# Altium footprint library En.PcbLib: 157 footprints (part 2 of 10)
Each footprint in its own frame and in the unit in brackets; x right, y up, seen from the top. Pads: shape width x height; smd on the part's side, far side on the other; paste and mask are expansions set on the pad; w line width, h text height; cw(c..) or ccw(c..) is an arc to the next point about the centre after c.
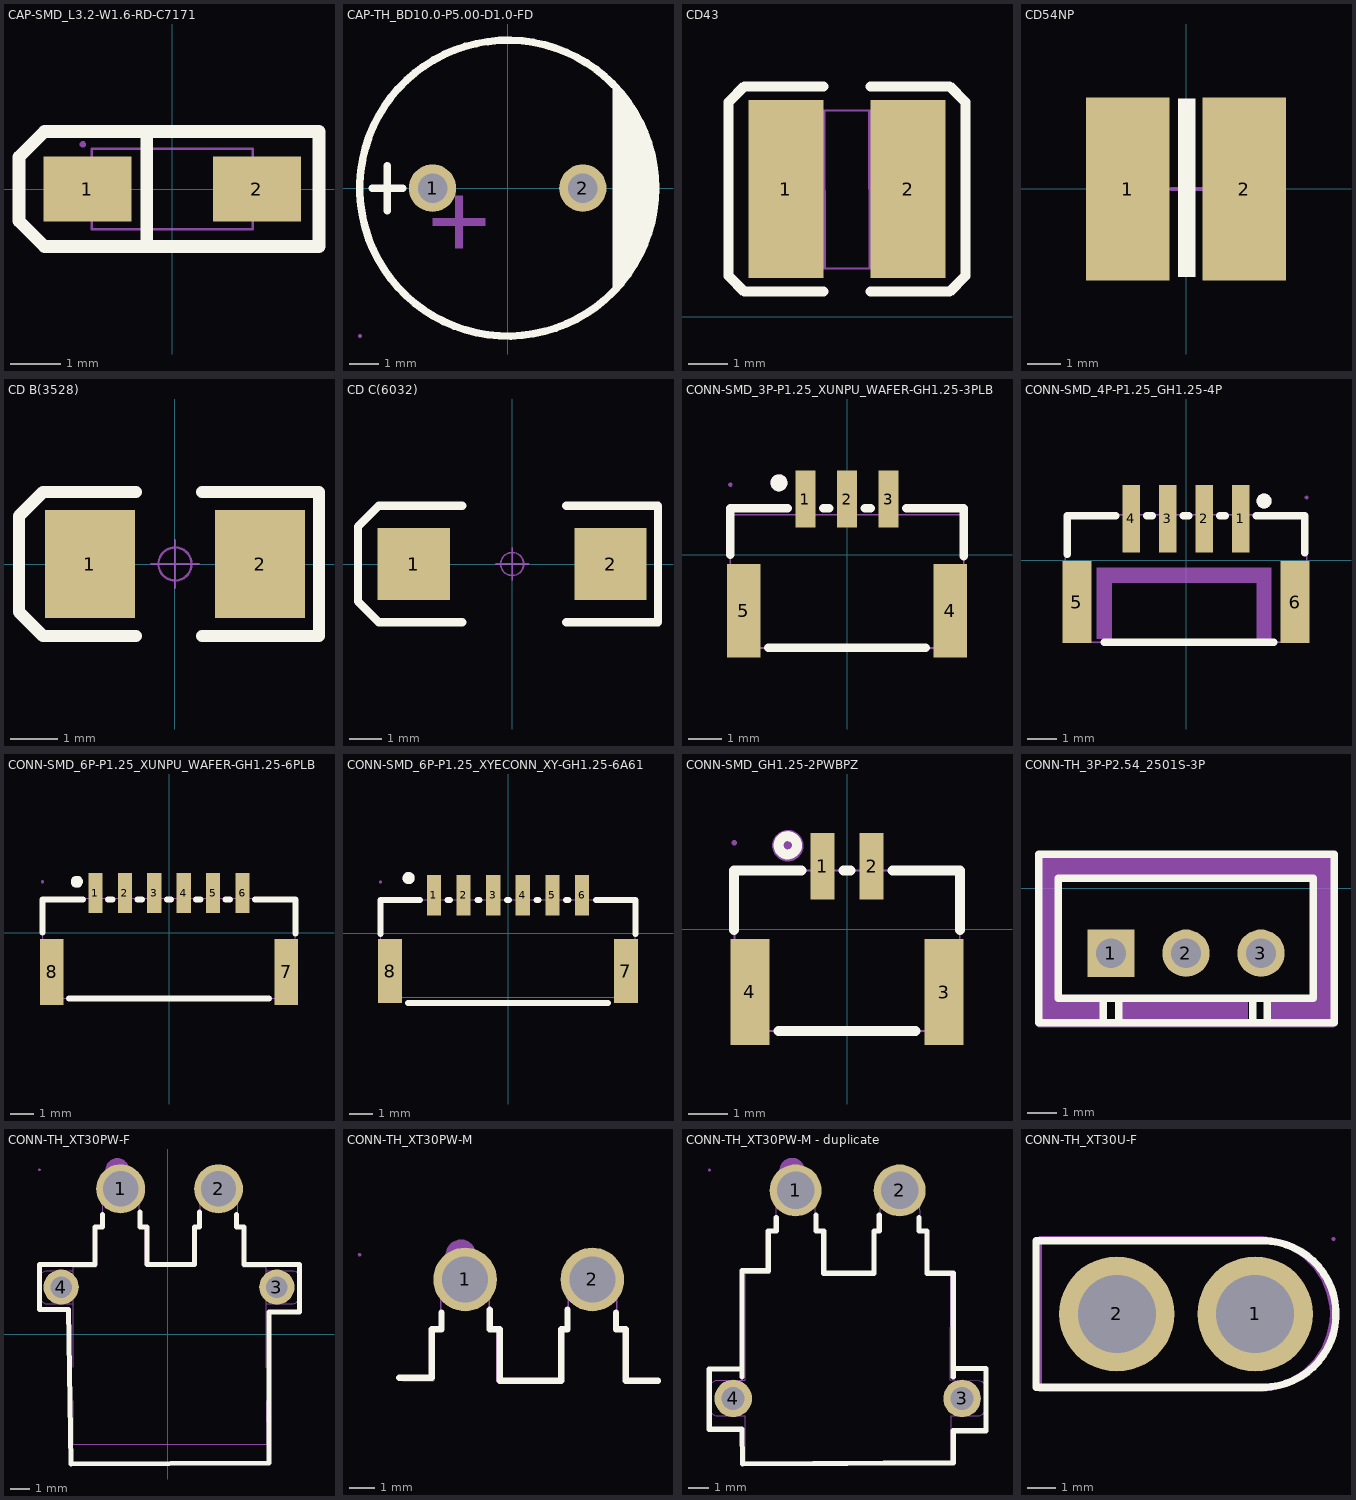
[diagram p1: the footprints below, top view; thin cyan lines are the x and y axes]

## CAP-SMD_L3.2-W1.6-RD-C7171 [mm]
pads (2):
  rect 1.758x1.296 smd: 1(-1.686,0) 2(1.686,0)
Top Overlay:
  lines w0.254: -0.508,-1.016 -0.508,1.016 ; -3.048,-0.635 -3.048,0.635 -2.54,1.143 -0.889,1.143 2.921,1.143 2.921,-1.143 -0.381,-1.143 -2.54,-1.143 -3.048,-0.635
Mechanical 15:
  region: -1.83,0.6 -1.83,-0.6 -0.98,-0.6 -0.98,0.6
  region: 1.83,0.6 1.83,-0.6 0.98,-0.6 0.98,0.6
  region: -1.718,0.889 -1.719,0.913 -1.754,0.946 -1.802,0.946 -1.837,0.913 -1.838,0.889 -1.837,0.865 -1.802,0.832 -1.754,0.832 -1.719,0.865
  lines w0.051: -1.6,-0.8 -1.6,0.8 1.6,0.8 1.6,-0.8 -1.6,-0.8
3D body "User Library-CAP_TANT_3216-18_A_case-1.SLDPRT": height 1.7, standoff 0, extent -1.7,-0.9 1.7,0.9

## CAP-TH_BD10.0-P5.00-D1.0-FD [mm]
pads (2):
  round 1.6 hole 1: 1(-2.54,0) 2(2.54,0)
Top Overlay:
  circle w0.254: c0,0 r5
  region: 3.556,3.556 3.556,-3.556 4.318,-2.54 4.826,-1.016 5.08,0.508 4.826,1.524
  lines w0.254: -4.572,0 -3.556,0 ; -4.064,-0.762 -4.064,0.762
Mechanical 6:
  region: -1.778,-0.762 -1.778,-2.032 -1.524,-2.032 -1.524,-0.254 -1.778,-0.254
  region: -2.54,-1.016 -0.762,-1.016 -0.762,-1.27 -2.54,-1.27
Mechanical 15:
  region: -2.24,0 -2.241,0.059 -2.288,0.167 -2.372,0.25 -2.481,0.294 -2.599,0.294 -2.708,0.25 -2.792,0.167 -2.839,0.059 -2.84,0 -2.839,-0.059 -2.792,-0.167 -2.708,-0.25 -2.599,-0.294 -2.481,-0.294 -2.372,-0.25 -2.288,-0.167 -2.241,-0.059
  region: 2.84,0 2.839,0.059 2.792,0.167 2.708,0.25 2.599,0.294 2.481,0.294 2.372,0.25 2.288,0.167 2.241,0.059 2.24,0 2.241,-0.059 2.288,-0.167 2.372,-0.25 2.481,-0.294 2.599,-0.294 2.708,-0.25 2.792,-0.167 2.839,-0.059
  region: -4.94,-5 -4.94,-4.975 -4.975,-4.94 -5.025,-4.94 -5.06,-4.975 -5.06,-5 -5.06,-5.025 -5.025,-5.06 -4.975,-5.06 -4.94,-5.025
  lines w0.051: -5,0 ccw(c0,0) 5,0 ccw(c0,0) -5,0
3D body "User Library-CE_R200_D400_H800.SLDPRT": height 20.32, standoff -2.9, extent -4.953,-5.078 5.207,5.078

## CD43 [mm]
pads (2):
  rect 1.9x4.5 smd: 1(30.787,3.236) 2(33.887,3.236)
Top Overlay:
  lines w0.254: 31.737,0.635 29.736,0.635 29.337,1.036 29.337,5.436 29.736,5.837 31.737,5.837 ; 32.936,0.635 34.938,0.635 35.336,1.036 35.336,5.436 34.938,5.837 32.936,5.837
Mechanical 15:
  drawing of 84 lines, arcs and shapes, not listed
3D body "User Library-CD43NP.sldprt": height 3.5, standoff 0, extent 29.937,1.086 34.737,5.386

## CD54NP [mm]
pads (2):
  rect 2.5x5.5 smd mask+0: 1(-1.752,-0.001) 2(1.748,-0.001)
Top Overlay:
  rectangle: -0.248,-2.644 0.276,2.722
Mechanical 2:
  lines w0.127: -0.442,-0.001 0.483,-0.001 ; -0.002,-0.257 -0.002,0.321 ; -2.831,-0.343 ccw(c-2.902,-0.001) -2.831,0.342 cw(c-0.002,-0.001) -1.275,2.549 -0.652,2.549 -0.652,-2.551 -1.275,-2.551 cw(c-0.002,-0.001) -2.831,-0.343 ; 0.648,-2.551 0.648,2.549 1.271,2.549 cw(c-0.002,-0.001) 2.827,0.342 ccw(c2.898,-0.001) 2.827,-0.343 cw(c-0.002,-0.001) 1.271,-2.551 0.648,-2.551
3D body "CD54.STEP": height 4.5, standoff -0.05, extent -2.895,-2.599 2.874,2.601

## CD B(3528) [mil] "长3.5mm，宽2.8mm，厚1.9mm"
height 370.08
pads (2):
  rect 75x90 smd: 1(-70.87,-0.01) 2(70.86,-0.01)
Top Overlay:
  lines w10: -32.51,-60 -110,-60 -130,-40 -130,40 -110,60 -32.51,60 ; 22.49,-60 120,-60 120,60 22.49,60
Mechanical 15:
  circle w1.97: c0,0 r13.78
  lines w1.97: -19.68,0 19.69,0 ; 0,-19.68 0,19.68
3D body "CD B(3528).STEP": height 74.84, standoff -0.3, extent -68.92,-55.12 68.91,55.11

## CD C(6032) [mm] "长6.0mm，宽3.2mm，厚2.5mm"
height 9.4
pads (2):
  rect 2.2x2.2 smd: 1(-3,0) 2(3,0)
Top Overlay:
  lines w0.254: -1.524,-1.778 -4.064,-1.778 -4.699,-1.143 -4.699,1.143 -4.064,1.778 -1.524,1.778 ; 1.651,-1.778 4.445,-1.778 4.445,1.778 1.651,1.778
Mechanical 15:
  circle w0.05: c0,0 r0.35
  lines w0.05: -0.5,0 0.5,0 ; 0,-0.5 0,0.5
3D body "CD C(6032).STEP": height 2.5, standoff -0.01, extent -3,-1.6 3,1.6

## CONN-SMD_3P-P1.25_XUNPU_WAFER-GH1.25-3PLB [mm]
pads (5):
  rect 0.6x1.7 smd: 1(-1.25,1.675) 2(0,1.675) 3(1.25,1.675)
  rect 1x2.8 smd: 4(3.1,-1.675) 5(-3.1,-1.675)
Top Overlay:
  circle w0.254: c-2.042,2.159 r0.127
  lines w0.254: -3.5,0 -3.5,1.397 -1.781,1.397 ; -2.369,-2.794 2.369,-2.794 ; -0.719,1.397 -0.531,1.397 ; 0.531,1.397 0.719,1.397 ; 1.781,1.397 3.5,1.397 3.5,-0.044
Mechanical 6:
  circle w0.254: c-2.042,2.159 r0.127
Mechanical 15:
  region: 3.2,-2.675 3,-2.675 3,-0.675 3.2,-0.675
  region: -3,-2.675 -3.2,-2.675 -3.2,-0.675 -3,-0.675
  region: 1.35,1.006 1.15,1.006 1.15,2.106 1.35,2.106
  region: 0.1,1.006 -0.1,1.006 -0.1,2.106 0.1,2.106
  region: -1.15,1.006 -1.35,1.006 -1.35,2.106 -1.15,2.106
  region: -3.44,2.106 -3.44,2.131 -3.475,2.166 -3.525,2.166 -3.56,2.131 -3.56,2.106 -3.56,2.081 -3.525,2.046 -3.475,2.046 -3.44,2.081
  lines w0.051: -3.5,-2.794 3.5,-2.794 3.5,1.206 -3.5,1.206 -3.5,-2.794
3D body "wafer-gh1.25-3plb.step": height 5.07, standoff 0.87, extent -3.535,-2.964 3.525,1.986

## CONN-SMD_4P-P1.25_GH1.25-4P [mm]
pads (6):
  rect 0.6x2.3 smd mask+0.051: 1(1.875,1.425) 2(0.625,1.425) 3(-0.625,1.425) 4(-1.875,1.425)
  rect 1x2.8 smd mask+0.051: 5(-3.725,-1.425) 6(3.725,-1.425)
Top Overlay:
  circle w0.254: c2.667,2.028 r0.127
  lines w0.254: -4.064,0.206 -4.064,1.52 -2.406,1.52 ; -2.794,-2.798 2.994,-2.798 ; -1.344,1.52 -1.156,1.52 ; -0.094,1.52 0.094,1.52 ; 1.156,1.52 1.344,1.52 ; 2.406,1.52 4.064,1.52 4.064,0.25
Mechanical 6:
  circle w0.254: c2.667,2.028 r0.127
  region: -3.048,-0.258 2.921,-0.258 2.921,-2.671 2.413,-2.671 2.413,-0.766 -3.048,-0.766
  region: -3.048,-0.766 -3.048,-2.671 -2.54,-2.671 -2.54,-0.766
Mechanical 15:
  region: 4.185,2.15 4.185,2.175 4.15,2.21 4.1,2.21 4.065,2.175 4.065,2.15 4.065,2.125 4.1,2.09 4.15,2.09 4.185,2.125 4.185,2.15
  region: 0.725,1.15 0.525,1.15 0.525,2.15 0.725,2.15
  region: -0.525,1.15 -0.725,1.15 -0.725,2.15 -0.525,2.15
  region: -1.775,1.15 -1.975,1.15 -1.975,2.15 -1.775,2.15
  region: 1.975,1.15 1.775,1.15 1.775,2.15 1.975,2.15
  region: -3.625,-2.798 -3.825,-2.798 -3.825,-0.798 -3.625,-0.798
  region: 3.825,-2.798 3.625,-2.798 3.625,-0.798 3.825,-0.798
  lines w0.051: -4.125,-2.798 -4.125,1.552 4.125,1.552 4.125,-2.798 -4.125,-2.798
3D body "User Library-GH-4-90.STEP": height 4.13, standoff -0.02, extent -4.069,-2.403 4.191,2.149

## CONN-SMD_6P-P1.25_XUNPU_WAFER-GH1.25-6PLB [mm]
pads (8):
  rect 0.6x1.7 smd: 1(-3.125,1.675) 2(-1.875,1.675) 3(-0.625,1.675) 4(0.625,1.675) 5(1.875,1.675) 6(3.125,1.675)
  rect 1x2.8 smd: 7(4.975,-1.675) 8(-4.975,-1.675)
Top Overlay:
  circle w0.254: c-3.917,2.159 r0.127
  lines w0.254: -5.375,0 -5.375,1.397 -3.656,1.397 ; -4.244,-2.794 4.244,-2.794 ; -2.594,1.397 -2.406,1.397 ; -1.344,1.397 -1.156,1.397 ; -0.094,1.397 0.094,1.397 ; 1.156,1.397 1.344,1.397 ; 2.406,1.397 2.594,1.397 ; 3.656,1.397 5.375,1.397 5.375,-0.044
Mechanical 6:
  circle w0.254: c-3.917,2.159 r0.127
Mechanical 15:
  region: -5.315,2.159 -5.316,2.183 -5.35,2.217 -5.399,2.217 -5.434,2.183 -5.435,2.159 -5.434,2.134 -5.399,2.1 -5.35,2.1 -5.316,2.134
  region: 3.225,1.359 3.025,1.359 3.025,2.159 3.225,2.159
  region: 1.975,1.359 1.775,1.359 1.775,2.159 1.975,2.159
  region: -3.025,1.359 -3.225,1.359 -3.225,2.159 -3.025,2.159
  region: -1.775,1.359 -1.975,1.359 -1.975,2.159 -1.775,2.159
  region: -0.525,1.359 -0.725,1.359 -0.725,2.159 -0.525,2.159
  region: 0.725,1.359 0.525,1.359 0.525,2.159 0.725,2.159
  region: 5.075,-2.791 4.875,-2.791 4.875,-0.791 5.075,-0.791
  region: -4.875,-2.791 -5.075,-2.791 -5.075,-0.791 -4.875,-0.791
  lines w0.051: -5.375,-2.791 -5.375,1.459 5.375,1.459 5.375,-2.791 -5.375,-2.791
3D body "zx-bx-gh1.25-lt6.step": height 4.05, standoff -0.01, extent -5.338,-2.787 5.412,2.173

## CONN-SMD_6P-P1.25_XYECONN_XY-GH1.25-6A61 [mm]
pads (8):
  rect 0.6x1.7 smd paste+0 mask+0.05: 1(-3.125,1.6) 2(-1.875,1.6) 3(-0.625,1.6) 4(0.625,1.6) 5(1.875,1.6) 6(3.125,1.6)
  rect 1x2.7 smd paste+0 mask+0.05: 7(4.975,-1.6) 8(-4.975,-1.6)
Top Overlay:
  circle w0.254: c-4.19,2.318 r0.127
  lines w0.254: -5.375,-0.033 -5.375,1.4 -3.706,1.4 ; -4.225,-2.95 4.225,-2.95 ; -2.544,1.4 -2.456,1.4 ; -1.294,1.4 -1.206,1.4 ; -0.044,1.4 0.044,1.4 ; 1.206,1.4 1.294,1.4 ; 2.456,1.4 2.544,1.4 ; 3.706,1.4 5.375,1.4 5.375,-0.033
Mechanical 6:
  circle w0.254: c-4.19,2.318 r0.127
Mechanical 15:
  region: 5.075,-2.6 4.875,-2.6 4.875,-0.6 5.075,-0.6
  region: 3.025,2.15 3.225,2.15 3.225,1.1 3.025,1.1
  region: 1.775,2.15 1.975,2.15 1.975,1.1 1.775,1.1
  region: 0.525,2.15 0.725,2.15 0.725,1.1 0.525,1.1
  region: -0.725,2.15 -0.525,2.15 -0.525,1.1 -0.725,1.1
  region: -5.075,-0.6 -4.875,-0.6 -4.875,-2.6 -5.075,-2.6
  region: -1.975,2.15 -1.775,2.15 -1.775,1.1 -1.975,1.1
  region: -3.225,2.15 -3.025,2.15 -3.025,1.1 -3.225,1.1
  region: -5.315,2.15 -5.315,2.175 -5.35,2.209 -5.399,2.209 -5.434,2.175 -5.435,2.15 -5.434,2.126 -5.4,2.091 -5.351,2.091 -5.316,2.126
  lines w0.051: -5.375,-2.7 5.375,-2.7 5.375,1.4 -5.375,1.4 -5.375,-2.7
3D body "xy-gh1.25-6a61.step": height 4.34, standoff -0.01, extent -5.375,-2.55 5.385,2.3

## CONN-SMD_GH1.25-2PWBPZ [mm]
pads (4):
  rect 0.6x1.7 smd mask+0.051: 1(-0.625,1.602) 2(0.625,1.602)
  rect 1x2.7 smd mask+0.051: 3(2.475,-1.602) 4(-2.475,-1.598)
Top Overlay:
  circle w0.254: c-1.51,2.14 r0.233
  lines w0.254: -2.88,-0.017 -2.88,1.5 -1.156,1.5 ; -1.744,-2.6 1.744,-2.6 ; -0.094,1.5 0.094,1.5 ; 1.156,1.5 2.88,1.5 2.88,-0.021
Mechanical 6:
  circle w0.4: c-1.51,2.13 r0.2
Mechanical 15:
  region: -2.815,2.202 -2.815,2.227 -2.85,2.262 -2.9,2.262 -2.935,2.227 -2.935,2.202 -2.935,2.177 -2.9,2.142 -2.85,2.142 -2.815,2.177 -2.815,2.202
  region: 0.525,2.202 0.725,2.202 0.725,1.002 0.525,1.002
  region: -0.725,2.202 -0.525,2.202 -0.525,1.002 -0.725,1.002
  region: 2.375,-0.602 2.575,-0.602 2.575,-2.602 2.375,-2.602
  region: -2.575,-0.598 -2.375,-0.598 -2.375,-2.598 -2.575,-2.598
  lines w0.051: -2.875,-2.598 -2.875,1.502 2.875,1.502 2.875,-2.598 -2.875,-2.598
3D body "User Library-GH-2-180.sldprt": height 4.22, standoff 0.02, extent -3.007,-2.665 2.753,2.285

## CONN-TH_3P-P2.54_2501S-3P [mm]
pads (3):
  rect 1.6x1.6 hole 1: 1(37.211,-2.199)
  round 1.6 hole 1: 2(39.751,-2.199) 3(42.291,-2.199)
Top Overlay:
  lines w0.254: 36.957,-4.549 36.957,-3.723 ; 37.472,-4.549 37.472,-3.723 ; 42.019,-4.549 42.019,-3.723 ; 42.502,-4.549 42.502,-3.723 ; 34.771,-4.549 44.771,-4.549 44.771,1.151 34.771,1.151 34.771,-4.549 ; 35.433,-3.723 35.433,0.341 44.069,0.341 44.069,-3.723 35.433,-3.723
Mechanical 6:
  region: 42.545,-4.485 42.545,-3.723 44.069,-3.723 44.069,0.341 35.433,0.341 35.433,-3.723 36.957,-3.723 36.957,-4.485 34.671,-4.485 34.671,1.103 44.831,1.103 44.831,-4.485
  region: 37.531,-4.499 41.849,-4.499 41.849,-3.737 37.531,-3.737
Mechanical 15:
  region: 34.811,1.201 34.81,1.225 34.776,1.26 34.727,1.26 34.692,1.225 34.691,1.201 34.692,1.176 34.727,1.142 34.776,1.142 34.81,1.176
  region: 36.886,-1.874 37.536,-1.874 37.536,-2.524 36.886,-2.524
  region: 39.426,-1.874 40.076,-1.874 40.076,-2.524 39.426,-2.524
  region: 41.966,-1.874 42.616,-1.874 42.616,-2.524 41.966,-2.524
  lines w0.051: 34.751,-4.699 44.751,-4.699 44.751,1.201 34.751,1.201 34.751,-4.699
3D body "User Library-XH2_54-3P.sldprt": height 7, standoff -1.8, extent 34.898,-4.813 44.858,0.987

## CONN-TH_XT30PW-F [mm]
pads (4):
  round 2.5 hole 1.8: 1(-2.394,7.435) 2(2.606,7.435)
  round 1.8 hole 1.1: 3(5.588,2.413) 4(-5.436,2.413)
Top Overlay:
  lines w0.254: -3.323,6.118 -3.323,5.483 -3.704,5.483 -3.704,3.556 -4.974,3.556 -6.544,3.556 -6.544,1.27 -5.071,1.27 -4.927,-6.629 5.186,-6.571 5.186,1.143 6.756,1.143 6.756,3.556 5.186,3.556 3.916,3.556 3.916,5.483 3.535,5.483 3.535,6.118 ; -1.418,6.245 -1.418,5.483 -1.037,5.483 -1.037,3.556 1.376,3.556 1.376,5.483 1.63,5.483 1.63,6.245
Mechanical 6:
  circle w0.6: c-2.561,8.404 r0.3
Mechanical 15:
  drawing of 94 lines, arcs and shapes, not listed
3D body "User Library-XT30PW-F.sldprt": height 5, standoff -2, extent -6.523,-6.499 6.777,8.401

## CONN-TH_XT30PW-M [mm]
pads (2):
  round 2.5 hole 1.8: 1(42.945,-26.347) 2(47.945,-26.347)
Top Overlay:
  lines w0.254: 40.365,-30.204 41.635,-30.204 41.635,-28.299 42.016,-28.299 42.016,-27.664 ; 43.921,-27.537 43.921,-28.299 44.302,-28.299 44.302,-30.331 46.715,-30.331 46.715,-28.299 46.969,-28.299 46.969,-27.537 ; 48.874,-27.664 48.874,-28.299 49.255,-28.299 49.255,-30.331 50.525,-30.331
Mechanical 6:
  circle w0.6: c42.778,-25.378 r0.3
Mechanical 15:
  region: 48.595,-26.347 48.595,-26.262 48.551,-26.096 48.465,-25.948 48.344,-25.827 48.196,-25.742 48.031,-25.697 47.859,-25.697 47.694,-25.742 47.546,-25.827 47.425,-25.948 47.339,-26.096 47.295,-26.262 47.295,-26.347 47.295,-26.433 47.339,-26.598 47.425,-26.747 47.546,-26.868 47.694,-26.953 47.859,-26.998 48.031,-26.998 48.196,-26.953 48.344,-26.868 48.465,-26.747 48.551,-26.598 48.595,-26.433
  region: 43.595,-26.347 43.595,-26.262 43.551,-26.096 43.465,-25.948 43.344,-25.827 43.196,-25.742 43.031,-25.697 42.859,-25.697 42.694,-25.742 42.546,-25.827 42.425,-25.948 42.339,-26.096 42.295,-26.262 42.295,-26.347 42.295,-26.433 42.339,-26.598 42.425,-26.747 42.546,-26.868 42.694,-26.953 42.859,-26.998 43.031,-26.998 43.196,-26.953 43.344,-26.868 43.465,-26.747 43.551,-26.598 43.595,-26.433
  region: 38.855,-25.376 38.855,-25.351 38.82,-25.316 38.77,-25.316 38.735,-25.351 38.735,-25.376 38.735,-25.401 38.77,-25.436 38.82,-25.436 38.855,-25.401
  lines w0.051: 40.49,-30.323 41.704,-30.327 41.697,-28.328 41.994,-28.33 41.994,-26.255 42.025,-26.095 42.073,-25.95 42.094,-25.912 42.094,-25.911 42.14,-25.804 42.258,-25.682 42.361,-25.574 42.498,-25.489 42.635,-25.428 42.78,-25.384 42.956,-25.377 43.097,-25.388 43.25,-25.428 43.398,-25.491 43.531,-25.579 43.642,-25.687 43.75,-25.813 43.818,-25.956 43.865,-26.101 43.897,-26.25 43.895,-28.328 44.196,-28.328 44.195,-30.33 46.701,-30.327 46.696,-28.329 46.998,-28.325 46.993,-26.256 47.025,-26.093 47.076,-25.942 47.147,-25.804 47.244,-25.688 47.366,-25.576 47.497,-25.488 47.627,-25.429 47.783,-25.387 47.934,-25.376 48.105,-25.386 48.26,-25.431 48.392,-25.486 48.522,-25.578 48.651,-25.691 48.745,-25.807 48.812,-25.944 48.864,-26.09 48.897,-26.243 48.904,-28.325 49.185,-28.329 49.197,-30.33 50.395,-30.325

## CONN-TH_XT30PW-M - duplicate [mm]
pads (4):
  round 2.5 hole 1.8: 1(42.945,-26.347) 2(47.945,-26.347)
  round 1.8 hole 1.1: 3(50.945,-36.347) 4(39.945,-36.347)
Top Overlay:
  lines w0.254: 40.365,-35.297 40.365,-31.3 40.365,-30.204 41.635,-30.204 41.635,-28.299 42.016,-28.299 42.016,-27.664 ; 40.365,-34.932 38.795,-34.932 38.795,-37.828 40.365,-37.828 40.395,-39.497 50.525,-39.439 50.525,-37.897 ; 43.921,-27.537 43.921,-28.299 44.302,-28.299 44.302,-30.331 46.715,-30.331 46.715,-28.299 46.969,-28.299 46.969,-27.537 ; 48.874,-27.664 48.874,-28.299 49.255,-28.299 49.255,-30.331 50.525,-30.331 50.525,-31.3 50.525,-35.297 ; 50.525,-37.898 52.095,-37.898 52.095,-34.907 50.525,-34.907
Mechanical 6:
  circle w0.6: c42.778,-25.378 r0.3
Mechanical 15:
  drawing of 94 lines, arcs and shapes, not listed
3D body "User Library-XT30PW-M.sldprt": height 5, standoff -2, extent 38.77,-39.483 52.07,-25.541

## CONN-TH_XT30U-F [mm]
pads (2):
  round 4 hole 2.7: 1(44.818,-8.984) 2(40.018,-8.984)
Top Overlay:
  lines w0.254: 45.085,-11.524 ccw(c45.085,-8.984) 45.085,-6.444 ; 45.212,-11.524 37.211,-11.524 37.211,-6.444 45.212,-6.444
Mechanical 6:
  region: 47.418,-8.984 47.406,-8.739 47.31,-8.258 47.123,-7.805 46.85,-7.398 46.504,-7.051 46.096,-6.779 45.644,-6.592 45.163,-6.496 44.918,-6.484 44.918,-6.284 45.095,-6.284 45.446,-6.33 45.788,-6.422 46.115,-6.557 46.421,-6.734 46.702,-6.95 46.952,-7.2 47.168,-7.481 47.345,-7.787 47.48,-8.114 47.572,-8.456 47.618,-8.807 47.618,-8.984
  region: 44.918,-11.484 45.163,-11.472 45.644,-11.376 46.096,-11.189 46.504,-10.917 46.85,-10.57 47.123,-10.162 47.31,-9.71 47.406,-9.229 47.418,-8.984 47.618,-8.984 47.618,-9.161 47.572,-9.512 47.48,-9.854 47.345,-10.181 47.168,-10.487 46.952,-10.768 46.702,-11.018 46.421,-11.234 46.115,-11.411 45.788,-11.546 45.446,-11.638 45.095,-11.684 44.918,-11.684
  region: 44.918,-6.284 37.318,-6.284 37.218,-6.384 37.218,-11.584 37.318,-11.684 44.918,-11.684 44.918,-11.484 37.418,-11.484 37.418,-6.484 44.918,-6.484
Mechanical 15:
  region: 45.918,-8.984 45.918,-8.852 45.85,-8.598 45.718,-8.37 45.532,-8.184 45.304,-8.052 45.05,-7.984 44.786,-7.984 44.532,-8.052 44.304,-8.184 44.118,-8.37 43.986,-8.598 43.918,-8.852 43.918,-8.984 43.918,-9.116 43.986,-9.37 44.118,-9.598 44.304,-9.784 44.532,-9.916 44.786,-9.984 45.05,-9.984 45.304,-9.916 45.532,-9.784 45.718,-9.598 45.85,-9.37 45.918,-9.116
  region: 40.918,-8.984 40.918,-8.852 40.85,-8.598 40.718,-8.37 40.532,-8.184 40.304,-8.052 40.05,-7.984 39.786,-7.984 39.532,-8.052 39.304,-8.184 39.118,-8.37 38.986,-8.598 38.918,-8.852 38.918,-8.984 38.918,-9.116 38.986,-9.37 39.118,-9.598 39.304,-9.784 39.532,-9.916 39.786,-9.984 40.05,-9.984 40.304,-9.916 40.532,-9.784 40.718,-9.598 40.85,-9.37 40.918,-9.116
  region: 47.592,-6.384 47.592,-6.359 47.557,-6.324 47.507,-6.324 47.472,-6.359 47.472,-6.384 47.472,-6.409 47.507,-6.444 47.557,-6.444 47.592,-6.409
  lines w0.051: 37.318,-11.584 44.932,-11.584 ccw(c44.932,-8.984) 47.532,-8.984 ccw(c44.932,-8.984) 44.932,-6.384 37.338,-6.444 ccw(c37.338,-6.464) 37.318,-6.464 37.318,-11.584
3D body "User Library-xt30-f.sldprt": height 9.4, standoff -3, extent 37.191,-11.55 47.391,-6.35